# Altium footprint library 6-Connectors-4.PcbLib: 166 footprints (part 9 of 12)
Each footprint in its own frame and in the unit in brackets; x right, y up, seen from the top. Pads: shape width x height; smd on the part's side, far side on the other; paste and mask are expansions set on the pad; w line width, h text height; cw(c..) or ccw(c..) is an arc to the next point about the centre after c.
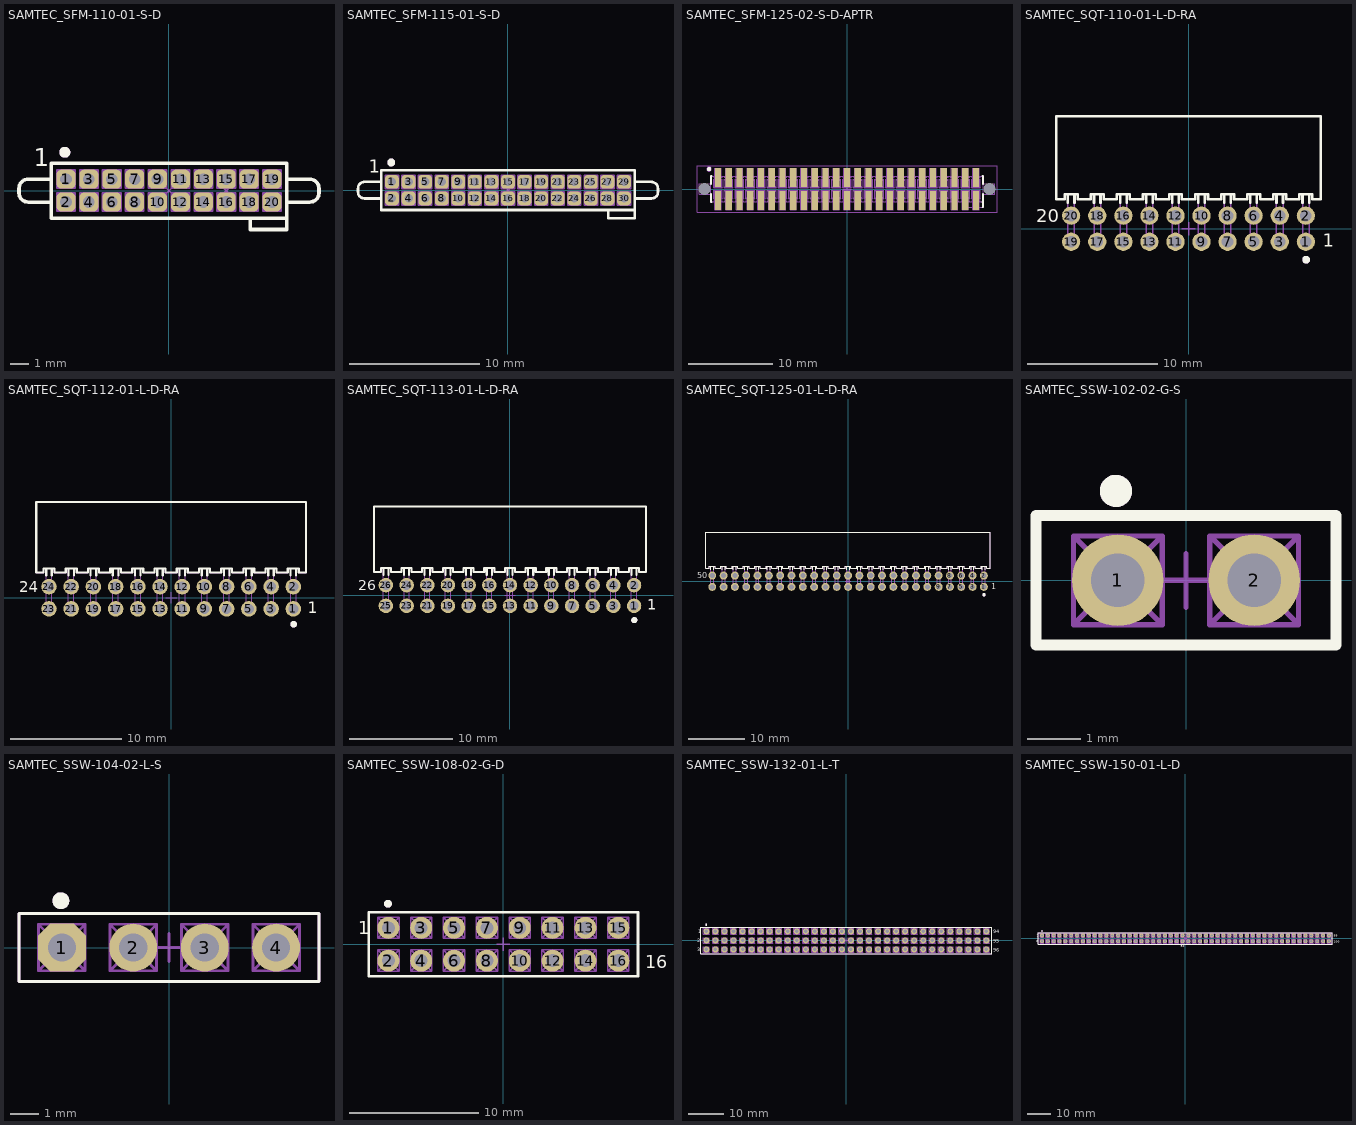
[diagram p8: the footprints below, top view; thin cyan lines are the x and y axes]

## SAMTEC_SFM-110-01-S-D [mm] "20 Contacts - Pitch 1.27mm - Dual Row Straight Through-Hole Socket"
height 4.57
pads (20):
  rrect50% 1.05x1.05 hole 0.65: 1(-5.715,0.635) 2(-5.715,-0.635) 3(-4.445,0.635) 4(-4.445,-0.635) 5(-3.175,0.635) 6(-3.175,-0.635) 7(-1.905,0.635) 8(-1.905,-0.635) 9(-0.635,0.635) 10(-0.635,-0.635) 11(0.635,0.635) 12(0.635,-0.635) 13(1.905,0.635) 14(1.905,-0.635) 15(3.175,0.635) 16(3.175,-0.635) 17(4.445,0.635) 18(4.445,-0.635) 19(5.715,0.635) 20(5.715,-0.635)
Top Overlay:
  circle w0.3: c-5.775,2.125 r0.15
  lines w0.2: -6.54,-0.635 -7.81,-0.635 cw(c-7.81,-0.127) -8.318,-0.127 -8.318,0.127 cw(c-7.81,0.127) -7.81,0.635 -6.54,0.635 ; 4.509,-1.524 4.509,-2.159 6.541,-2.159 6.541,1.524 -6.54,1.524 -6.54,-1.524 6.541,-1.524 ; 6.541,-0.635 7.811,-0.635 ccw(c7.811,-0.127) 8.319,-0.127 8.319,0.127 ccw(c7.811,0.127) 7.811,0.635 6.541,0.635
  text "1" at -7.487,1.337 h1
Mechanical 8:
  lines w0.1: -6.215,-0.635 -5.715,-0.635 ; -6.215,0.635 -5.715,0.635 ; -5.715,-1.135 -5.715,-0.635 ; -5.715,-0.135 -5.715,-0.635 ; -5.715,0.135 -5.715,0.635 ; -5.715,1.135 -5.715,0.635 ; -5.215,-0.635 -5.715,-0.635 ; -5.215,0.635 -5.715,0.635 ; -4.945,-0.635 -4.445,-0.635 ; -4.945,0.635 -4.445,0.635 ; -4.445,-1.135 -4.445,-0.635 ; -4.445,-0.135 -4.445,-0.635 ; -4.445,0.135 -4.445,0.635 ; -4.445,1.135 -4.445,0.635 ; -3.945,-0.635 -4.445,-0.635 ; -3.945,0.635 -4.445,0.635 ; -3.675,-0.635 -3.175,-0.635 ; -3.675,0.635 -3.175,0.635 ; -3.175,-1.135 -3.175,-0.635 ; -3.175,-0.135 -3.175,-0.635 ; -3.175,0.135 -3.175,0.635 ; -3.175,1.135 -3.175,0.635 ; -2.675,-0.635 -3.175,-0.635 ; -2.675,0.635 -3.175,0.635 ; -2.405,-0.635 -1.905,-0.635 ; -2.405,0.635 -1.905,0.635 ; -1.905,-1.135 -1.905,-0.635 ; -1.905,-0.135 -1.905,-0.635 ; -1.905,0.135 -1.905,0.635 ; -1.905,1.135 -1.905,0.635 ; -1.405,-0.635 -1.905,-0.635 ; -1.405,0.635 -1.905,0.635 ; -1.135,-0.635 -0.635,-0.635 ; -1.135,0.635 -0.635,0.635 ; -0.635,-1.135 -0.635,-0.635 ; -0.635,-0.135 -0.635,-0.635 ; -0.635,0.135 -0.635,0.635 ; -0.635,1.135 -0.635,0.635 ; -0.354,-0.354 0,0 ; -0.354,0.354 0,0 ; -0.135,-0.635 -0.635,-0.635 ; -0.135,0.635 -0.635,0.635 ; 0.135,-0.635 0.635,-0.635 ; 0.135,0.635 0.635,0.635 ; 0.354,-0.354 0,0 ; 0.354,0.354 0,0 ; 0.635,-1.135 0.635,-0.635 ; 0.635,-0.135 0.635,-0.635 ; 0.635,0.135 0.635,0.635 ; 0.635,1.135 0.635,0.635 ; 1.135,-0.635 0.635,-0.635 ; 1.135,0.635 0.635,0.635 ; 1.405,-0.635 1.905,-0.635 ; 1.405,0.635 1.905,0.635 ; 1.905,-1.135 1.905,-0.635 ; 1.905,-0.135 1.905,-0.635 ; 1.905,0.135 1.905,0.635 ; 1.905,1.135 1.905,0.635 ; 2.405,-0.635 1.905,-0.635 ; 2.405,0.635 1.905,0.635 ; 2.675,-0.635 3.175,-0.635 ; 2.675,0.635 3.175,0.635 ; 2.821,-0.354 3.175,0 ; 2.821,0.354 3.175,0 ; 3.175,-1.135 3.175,-0.635 ; 3.175,-0.135 3.175,-0.635 ; 3.175,0.135 3.175,0.635 ; 3.175,1.135 3.175,0.635 ; 3.529,-0.354 3.175,0 ; 3.529,0.354 3.175,0 ; 3.675,-0.635 3.175,-0.635 ; 3.675,0.635 3.175,0.635 ; 3.945,-0.635 4.445,-0.635 ; 3.945,0.635 4.445,0.635 ; 4.445,-1.135 4.445,-0.635 ; 4.445,-0.135 4.445,-0.635 ; 4.445,0.135 4.445,0.635 ; 4.445,1.135 4.445,0.635 ; 4.945,-0.635 4.445,-0.635 ; 4.945,0.635 4.445,0.635 ; 5.215,-0.635 5.715,-0.635 ; 5.215,0.635 5.715,0.635 ; 5.715,-1.135 5.715,-0.635 ; 5.715,-0.135 5.715,-0.635 ; 5.715,0.135 5.715,0.635 ; 5.715,1.135 5.715,0.635 ; 6.215,-0.635 5.715,-0.635 ; 6.215,0.635 5.715,0.635
Mechanical 14:
  drawing of 385 lines, arcs and shapes, not listed
  text "1" at -7.487,1.337 h1
3D body "SAMTEC_SFM-110-01-S-D.stp": height 4.57, standoff -2.74, extent -8.318,-2.159 8.319,1.524

## SAMTEC_SFM-115-01-S-D [mm] "30 Contacts - Pitch 1.27mm - Dual Row Straight Through-Hole Socket"
height 4.57
pads (30):
  rrect50% 1.05x1.05 hole 0.65: 1(-8.89,0.635) 2(-8.89,-0.635) 3(-7.62,0.635) 4(-7.62,-0.635) 5(-6.35,0.635) 6(-6.35,-0.635) 7(-5.08,0.635) 8(-5.08,-0.635) 9(-3.81,0.635) 10(-3.81,-0.635) 11(-2.54,0.635) 12(-2.54,-0.635) 13(-1.27,0.635) 14(-1.27,-0.635) 15(0,0.635) 16(0,-0.635) 17(1.27,0.635) 18(1.27,-0.635) 19(2.54,0.635) 20(2.54,-0.635) 21(3.81,0.635) 22(3.81,-0.635) 23(5.08,0.635) 24(5.08,-0.635) 25(6.35,0.635) 26(6.35,-0.635) 27(7.62,0.635) 28(7.62,-0.635) 29(8.89,0.635) 30(8.89,-0.635)
Top Overlay:
  circle w0.3: c-8.95,2.125 r0.15
  lines w0.2: -9.715,-0.635 -10.985,-0.635 cw(c-10.985,-0.127) -11.493,-0.127 -11.493,0.127 cw(c-10.985,0.127) -10.985,0.635 -9.715,0.635 ; 7.684,-1.524 7.684,-2.159 9.716,-2.159 9.716,1.524 -9.715,1.524 -9.715,-1.524 9.716,-1.524 ; 9.716,-0.635 10.986,-0.635 ccw(c10.986,-0.127) 11.494,-0.127 11.494,0.127 ccw(c10.986,0.127) 10.986,0.635 9.716,0.635
  text "1" at -10.662,1.337 h1
Mechanical 8:
  lines w0.1: -9.39,-0.635 -8.89,-0.635 ; -9.39,0.635 -8.89,0.635 ; -8.89,-1.135 -8.89,-0.635 ; -8.89,-0.135 -8.89,-0.635 ; -8.89,0.135 -8.89,0.635 ; -8.89,1.135 -8.89,0.635 ; -8.39,-0.635 -8.89,-0.635 ; -8.39,0.635 -8.89,0.635 ; -8.12,-0.635 -7.62,-0.635 ; -8.12,0.635 -7.62,0.635 ; -7.62,-1.135 -7.62,-0.635 ; -7.62,-0.135 -7.62,-0.635 ; -7.62,0.135 -7.62,0.635 ; -7.62,1.135 -7.62,0.635 ; -7.12,-0.635 -7.62,-0.635 ; -7.12,0.635 -7.62,0.635 ; -6.85,-0.635 -6.35,-0.635 ; -6.85,0.635 -6.35,0.635 ; -6.35,-1.135 -6.35,-0.635 ; -6.35,-0.135 -6.35,-0.635 ; -6.35,0.135 -6.35,0.635 ; -6.35,1.135 -6.35,0.635 ; -5.85,-0.635 -6.35,-0.635 ; -5.85,0.635 -6.35,0.635 ; -5.58,-0.635 -5.08,-0.635 ; -5.58,0.635 -5.08,0.635 ; -5.08,-1.135 -5.08,-0.635 ; -5.08,-0.135 -5.08,-0.635 ; -5.08,0.135 -5.08,0.635 ; -5.08,1.135 -5.08,0.635 ; -4.58,-0.635 -5.08,-0.635 ; -4.58,0.635 -5.08,0.635 ; -4.31,-0.635 -3.81,-0.635 ; -4.31,0.635 -3.81,0.635 ; -3.81,-1.135 -3.81,-0.635 ; -3.81,-0.135 -3.81,-0.635 ; -3.81,0.135 -3.81,0.635 ; -3.81,1.135 -3.81,0.635 ; -3.31,-0.635 -3.81,-0.635 ; -3.31,0.635 -3.81,0.635 ; -3.04,-0.635 -2.54,-0.635 ; -3.04,0.635 -2.54,0.635 ; -2.54,-1.135 -2.54,-0.635 ; -2.54,-0.135 -2.54,-0.635 ; -2.54,0.135 -2.54,0.635 ; -2.54,1.135 -2.54,0.635 ; -2.04,-0.635 -2.54,-0.635 ; -2.04,0.635 -2.54,0.635 ; -1.77,-0.635 -1.27,-0.635 ; -1.77,0.635 -1.27,0.635 ; -1.27,-1.135 -1.27,-0.635 ; -1.27,-0.135 -1.27,-0.635 ; -1.27,0.135 -1.27,0.635 ; -1.27,1.135 -1.27,0.635 ; -0.77,-0.635 -1.27,-0.635 ; -0.77,0.635 -1.27,0.635 ; -0.5,-0.635 0,-0.635 ; -0.5,0.635 0,0.635 ; -0.354,-0.354 0,0 ; -0.354,0.354 0,0 ; 0,-1.135 0,-0.635 ; 0,-0.135 0,-0.635 ; 0,0.135 0,0.635 ; 0,1.135 0,0.635 ; 0.354,-0.354 0,0 ; 0.354,0.354 0,0 ; 0.5,-0.635 0,-0.635 ; 0.5,0.635 0,0.635 ; 0.77,-0.635 1.27,-0.635 ; 0.77,0.635 1.27,0.635 ; 1.27,-1.135 1.27,-0.635 ; 1.27,-0.135 1.27,-0.635 ; 1.27,0.135 1.27,0.635 ; 1.27,1.135 1.27,0.635 ; 1.77,-0.635 1.27,-0.635 ; 1.77,0.635 1.27,0.635 ; 2.04,-0.635 2.54,-0.635 ; 2.04,0.635 2.54,0.635 ; 2.54,-1.135 2.54,-0.635 ; 2.54,-0.135 2.54,-0.635 ; 2.54,0.135 2.54,0.635 ; 2.54,1.135 2.54,0.635 ; 3.04,-0.635 2.54,-0.635 ; 3.04,0.635 2.54,0.635 ; 3.31,-0.635 3.81,-0.635 ; 3.31,0.635 3.81,0.635 ; 3.81,-1.135 3.81,-0.635 ; 3.81,-0.135 3.81,-0.635 ; 3.81,0.135 3.81,0.635 ; 3.81,1.135 3.81,0.635 ; 4.31,-0.635 3.81,-0.635 ; 4.31,0.635 3.81,0.635 ; 4.58,-0.635 5.08,-0.635 ; 4.58,0.635 5.08,0.635 ; 5.08,-1.135 5.08,-0.635 ; 5.08,-0.135 5.08,-0.635 ; 5.08,0.135 5.08,0.635 ; 5.08,1.135 5.08,0.635 ; 5.58,-0.635 5.08,-0.635 ; 5.58,0.635 5.08,0.635 ; 5.85,-0.635 6.35,-0.635 ; 5.85,0.635 6.35,0.635 ; 6.35,-1.135 6.35,-0.635 ; 6.35,-0.135 6.35,-0.635 ; 6.35,0.135 6.35,0.635 ; 6.35,1.135 6.35,0.635 ; 6.85,-0.635 6.35,-0.635 ; 6.85,0.635 6.35,0.635 ; 7.12,-0.635 7.62,-0.635 ; 7.12,0.635 7.62,0.635 ; 7.62,-1.135 7.62,-0.635 ; 7.62,-0.135 7.62,-0.635 ; 7.62,0.135 7.62,0.635 ; 7.62,1.135 7.62,0.635 ; 8.12,-0.635 7.62,-0.635 ; 8.12,0.635 7.62,0.635 ; 8.39,-0.635 8.89,-0.635 ; 8.39,0.635 8.89,0.635 ; 8.89,-1.135 8.89,-0.635 ; 8.89,-0.135 8.89,-0.635 ; 8.89,0.135 8.89,0.635 ; 8.89,1.135 8.89,0.635 ; 9.39,-0.635 8.89,-0.635 ; 9.39,0.635 8.89,0.635
Mechanical 14:
  drawing of 377 lines, arcs and shapes, not listed
  text "1" at -10.662,1.337 h1
3D body "SAMTEC_SFM-115-01-S-D.stp": height 4.57, standoff -2.74, extent -11.493,-2.159 11.494,1.524

## SAMTEC_SFM-125-02-S-D-APTR [mm] "50 Contacts - Pitch 1.27mm - Top Entry, Dual Row Surface Mount Receptacle With Alignment Pin"
height 4.75
pads (52):
  rect 0.73x2.2 smd: 1(-15.24,1.365) 2(-15.24,-1.365) 3(-13.97,1.365) 4(-13.97,-1.365) 5(-12.7,1.365) 6(-12.7,-1.365) 7(-11.43,1.365) 8(-11.43,-1.365) 9(-10.16,1.365) 10(-10.16,-1.365) 11(-8.89,1.365) 12(-8.89,-1.365) 13(-7.62,1.365) 14(-7.62,-1.365) 15(-6.35,1.365) 16(-6.35,-1.365) 17(-5.08,1.365) 18(-5.08,-1.365) 19(-3.81,1.365) 20(-3.81,-1.365) 21(-2.54,1.365) 22(-2.54,-1.365) 23(-1.27,1.365) 24(-1.27,-1.365) 25(0,1.365) 26(0,-1.365) 27(1.27,1.365) 28(1.27,-1.365) 29(2.54,1.365) 30(2.54,-1.365) 31(3.81,1.365) 32(3.81,-1.365) 33(5.08,1.365) 34(5.08,-1.365) 35(6.35,1.365) 36(6.35,-1.365) 37(7.62,1.365) 38(7.62,-1.365) 39(8.89,1.365) 40(8.89,-1.365) 41(10.16,1.365) 42(10.16,-1.365) 43(11.43,1.365) 44(11.43,-1.365) 45(12.7,1.365) 46(12.7,-1.365) 47(13.97,1.365) 48(13.97,-1.365) 49(15.24,1.365) 50(15.24,-1.365)
  round 1 hole 1.4 unplated mask+0.2: MEC1(-16.83,0) MEC2(16.83,0)
Top Overlay:
  circle w0.25: c-16.292,2.35 r0.125
  circle w0.25: c-16.292,2.35 r0.125
  lines w0.2: -16.066,-0.564 -16.066,-1.524 -16.01,-1.524 ; -16.066,0.564 -16.066,1.524 -16.01,1.524 ; 16.01,-2.159 16.066,-2.159 16.066,-1.524 ; 16.01,-1.524 16.066,-1.524 ; 16.01,1.524 16.066,1.524 16.066,0.564 ; 16.066,-0.564 16.066,-1.524
Mechanical 8:
  drawing of 412 lines, arcs and shapes, not listed
Mechanical 14:
  drawing of 614 lines, arcs and shapes, not listed
Mechanical 15:
  lines w0.05: -17.713,-2.725 -17.713,2.725 17.713,2.725 17.713,-2.725 -17.713,-2.725
3D body "p220-073.stp": height 0.02, standoff 0, extent 14.875,0.265 15.605,2.465
3D body "p220-073.stp": height 0.02, standoff 0, extent 14.875,-2.464 15.605,-0.264
3D body "p220-073.stp": height 0.02, standoff 0, extent 13.605,-2.464 14.335,-0.264
3D body "p220-073.stp": height 0.02, standoff 0, extent 13.605,0.265 14.335,2.465
3D body "p220-073.stp": height 0.02, standoff 0, extent 12.335,0.265 13.065,2.465
3D body "p220-073.stp": height 0.02, standoff 0, extent 12.335,-2.464 13.065,-0.264
3D body "p220-073.stp": height 0.02, standoff 0, extent 11.065,-2.464 11.795,-0.264
3D body "p220-073.stp": height 0.02, standoff 0, extent 11.065,0.265 11.795,2.465
3D body "p220-073.stp": height 0.02, standoff 0, extent 9.795,0.265 10.525,2.465
3D body "p220-073.stp": height 0.02, standoff 0, extent 9.795,-2.464 10.525,-0.264
3D body "p220-073.stp": height 0.02, standoff 0, extent 8.525,-2.464 9.255,-0.264
3D body "p220-073.stp": height 0.02, standoff 0, extent 8.525,0.265 9.255,2.465
3D body "p220-073.stp": height 0.02, standoff 0, extent 7.255,0.265 7.985,2.465
3D body "p220-073.stp": height 0.02, standoff 0, extent 7.255,-2.464 7.985,-0.264
3D body "p220-073.stp": height 0.02, standoff 0, extent 5.985,-2.464 6.715,-0.264
3D body "p220-073.stp": height 0.02, standoff 0, extent 5.985,0.265 6.715,2.465
3D body "p220-073.stp": height 0.02, standoff 0, extent 4.715,-2.464 5.445,-0.264
3D body "p220-073.stp": height 0.02, standoff 0, extent 4.715,0.265 5.445,2.465
3D body "p220-073.stp": height 0.02, standoff 0, extent 3.445,0.265 4.175,2.465
3D body "p220-073.stp": height 0.02, standoff 0, extent 3.445,-2.464 4.175,-0.264
3D body "p220-073.stp": height 0.02, standoff 0, extent 2.175,-2.464 2.905,-0.264
3D body "p220-073.stp": height 0.02, standoff 0, extent 2.175,0.265 2.905,2.465
3D body "p220-073.stp": height 0.02, standoff 0, extent 0.905,0.265 1.635,2.465
3D body "p220-073.stp": height 0.02, standoff 0, extent 0.905,-2.464 1.635,-0.264
3D body "p220-073.stp": height 0.02, standoff 0, extent -0.365,-2.464 0.365,-0.264
3D body "p220-073.stp": height 0.02, standoff 0, extent -0.365,0.265 0.365,2.465
3D body "p220-073.stp": height 0.02, standoff 0, extent -1.635,0.265 -0.905,2.465
3D body "p220-073.stp": height 0.02, standoff 0, extent -1.635,-2.464 -0.905,-0.264
3D body "p220-073.stp": height 0.02, standoff 0, extent -2.905,-2.464 -2.175,-0.264
3D body "p220-073.stp": height 0.02, standoff 0, extent -2.905,0.265 -2.175,2.465
3D body "p220-073.stp": height 0.02, standoff 0, extent -4.175,0.265 -3.445,2.465
3D body "p220-073.stp": height 0.02, standoff 0, extent -4.175,-2.464 -3.445,-0.264
3D body "p220-073.stp": height 0.02, standoff 0, extent -5.445,-2.464 -4.715,-0.264
3D body "p220-073.stp": height 0.02, standoff 0, extent -5.445,0.265 -4.715,2.465
3D body "p220-073.stp": height 0.02, standoff 0, extent -6.715,-2.464 -5.985,-0.264
3D body "p220-073.stp": height 0.02, standoff 0, extent -6.715,0.265 -5.985,2.465
3D body "p220-073.stp": height 0.02, standoff 0, extent -7.985,0.265 -7.255,2.465
3D body "p220-073.stp": height 0.02, standoff 0, extent -7.985,-2.464 -7.255,-0.264
3D body "p220-073.stp": height 0.02, standoff 0, extent -9.255,-2.464 -8.525,-0.264
3D body "p220-073.stp": height 0.02, standoff 0, extent -9.255,0.265 -8.525,2.465
3D body "p220-073.stp": height 0.02, standoff 0, extent -10.525,0.265 -9.795,2.465
3D body "p220-073.stp": height 0.02, standoff 0, extent -10.525,-2.464 -9.795,-0.264
3D body "p220-073.stp": height 0.02, standoff 0, extent -11.795,-2.464 -11.065,-0.264
3D body "p220-073.stp": height 0.02, standoff 0, extent -11.795,0.265 -11.065,2.465
3D body "p220-073.stp": height 0.02, standoff 0, extent -13.065,-2.464 -12.335,-0.264
3D body "p220-073.stp": height 0.02, standoff 0, extent -13.065,0.265 -12.335,2.465
3D body "p220-073.stp": height 0.02, standoff 0, extent -14.335,-2.464 -13.605,-0.264
3D body "p220-073.stp": height 0.02, standoff 0, extent -14.335,0.265 -13.605,2.465
3D body "p220-073.stp": height 0.02, standoff 0, extent -15.605,-2.464 -14.875,-0.264
3D body "p220-073.stp": height 0.02, standoff 0, extent -15.605,0.265 -14.875,2.465
3D body "SAMTEC_SFM-125-02-S-D-APTR.stp": height 4.7, standoff -1.14, extent -17.465,-2.159 17.465,2.096

## SAMTEC_SQT-110-01-L-D-RA [mm] "20 Contacts - Pitch 2mm - Dual Row Right Angle Socket"
height 4
pads (20):
  round 1.4 hole 0.9: 1(9,-1) 2(9,1) 3(7,-1) 4(7,1) 5(5,-1) 6(5,1) 7(3,-1) 8(3,1) 9(1,-1) 10(1,1) 11(-1,-1) 12(-1,1) 13(-3,-1) 14(-3,1) 15(-5,-1) 16(-5,1) 17(-7,-1) 18(-7,1) 19(-9,-1) 20(-9,1)
Top Overlay:
  circle w0.3: c9.027,-2.378 r0.15
  lines w0.2: -9.25,2 -9.25,2.651 ; -8.75,2 -8.75,2.651 ; -7.25,2 -7.25,2.651 ; -6.75,2 -6.75,2.651 ; -5.25,2 -5.25,2.651 ; -4.75,2 -4.75,2.651 ; -3.25,2 -3.25,2.651 ; -2.75,2 -2.75,2.651 ; -1.25,2 -1.25,2.651 ; -0.75,2 -0.75,2.651 ; 0.75,2 0.75,2.651 ; 1.25,2 1.25,2.651 ; 2.75,2 2.75,2.651 ; 3.25,2 3.25,2.651 ; 4.75,2 4.75,2.651 ; 5.25,2 5.25,2.651 ; 6.75,2 6.75,2.651 ; 7.25,2 7.25,2.651 ; 8.75,2 8.75,2.651 ; 9.25,2 9.25,2.651 ; -10.15,2.27 -9.492,2.27 -9.492,2.651 -8.508,2.651 -8.508,2.27 -7.492,2.27 -7.492,2.651 -6.508,2.651 -6.508,2.27 -5.492,2.27 -5.492,2.651 -4.508,2.651 -4.508,2.27 -3.492,2.27 -3.492,2.651 -2.508,2.651 -2.508,2.27 -1.492,2.27 -1.492,2.651 -0.508,2.651 -0.508,2.27 0.508,2.27 0.508,2.651 1.492,2.651 1.492,2.27 2.508,2.27 2.508,2.651 3.492,2.651 3.492,2.27 4.508,2.27 4.508,2.651 5.492,2.651 5.492,2.27 6.508,2.27 6.508,2.651 7.492,2.651 7.492,2.27 8.508,2.27 8.508,2.651 9.492,2.651 9.492,2.27 10.15,2.27 10.15,8.62 -10.15,8.62 -10.15,2.27
  text "1" at 10.3,-1.4 h1.02
  text "20" at -11.7,0.5 h1
Mechanical 8:
  lines w0.1: -9.5,-1 -9,-1 ; -9.5,1 -9,1 ; -9,-1.5 -9,-1 ; -9,-0.5 -9,-1 ; -9,0.5 -9,1 ; -9,1.5 -9,1 ; -8.5,-1 -9,-1 ; -8.5,1 -9,1 ; -7.5,-1 -7,-1 ; -7.5,1 -7,1 ; -7,-1.5 -7,-1 ; -7,-0.5 -7,-1 ; -7,0.5 -7,1 ; -7,1.5 -7,1 ; -6.5,-1 -7,-1 ; -6.5,1 -7,1 ; -5.5,-1 -5,-1 ; -5.5,1 -5,1 ; -5,-1.5 -5,-1 ; -5,-0.5 -5,-1 ; -5,0.5 -5,1 ; -5,1.5 -5,1 ; -4.5,-1 -5,-1 ; -4.5,1 -5,1 ; -3.5,-1 -3,-1 ; -3.5,1 -3,1 ; -3,-1.5 -3,-1 ; -3,-0.5 -3,-1 ; -3,0.5 -3,1 ; -3,1.5 -3,1 ; -2.5,-1 -3,-1 ; -2.5,1 -3,1 ; -1.5,-1 -1,-1 ; -1.5,1 -1,1 ; -1,-1.5 -1,-1 ; -1,-0.5 -1,-1 ; -1,0.5 -1,1 ; -1,1.5 -1,1 ; -0.5,-1 -1,-1 ; -0.5,0 0,0 ; -0.5,1 -1,1 ; 0,-0.5 0,0 ; 0,0.5 0,0 ; 0.5,-1 1,-1 ; 0.5,0 0,0 ; 0.5,1 1,1 ; 1,-1.5 1,-1 ; 1,-0.5 1,-1 ; 1,0.5 1,1 ; 1,1.5 1,1 ; 1.5,-1 1,-1 ; 1.5,1 1,1 ; 2.5,-1 3,-1 ; 2.5,1 3,1 ; 3,-1.5 3,-1 ; 3,-0.5 3,-1 ; 3,0.5 3,1 ; 3,1.5 3,1 ; 3.5,-1 3,-1 ; 3.5,1 3,1 ; 4.5,-1 5,-1 ; 4.5,1 5,1 ; 5,-1.5 5,-1 ; 5,-0.5 5,-1 ; 5,0.5 5,1 ; 5,1.5 5,1 ; 5.5,-1 5,-1 ; 5.5,1 5,1 ; 6.5,-1 7,-1 ; 6.5,1 7,1 ; 7,-1.5 7,-1 ; 7,-0.5 7,-1 ; 7,0.5 7,1 ; 7,1.5 7,1 ; 7.5,-1 7,-1 ; 7.5,1 7,1 ; 8.5,-1 9,-1 ; 8.5,1 9,1 ; 9,-1.5 9,-1 ; 9,-0.5 9,-1 ; 9,0.5 9,1 ; 9,1.5 9,1 ; 9.5,-1 9,-1 ; 9.5,1 9,1
Mechanical 14:
  circle w0.3: c9.027,-2.378 r0.15
  lines w0.1: -9.25,2.651 -9.25,-1.218 -8.75,-1.219 -8.75,2.651 ; -7.25,2.651 -7.25,-1.22 -6.75,-1.22 -6.75,2.651 ; -5.25,2.651 -5.25,-1.221 -4.75,-1.221 -4.75,2.651 ; -3.25,2.651 -3.25,-1.222 -2.75,-1.223 -2.75,2.651 ; -1.25,2.651 -1.25,-1.224 -0.75,-1.224 -0.75,2.651 ; 0.75,2.651 0.75,-1.225 1.25,-1.225 1.25,2.651 ; 2.75,2.651 2.75,-1.226 3.25,-1.227 3.25,2.651 ; 4.75,2.651 4.75,-1.228 5.25,-1.228 5.25,2.651 ; 6.75,2.651 6.75,-1.229 7.25,-1.229 7.25,2.651 ; 8.75,2.651 8.75,-1.23 9.25,-1.23 9.25,2.651 ; -10.15,2.27 -9.492,2.27 -9.492,2.651 -8.508,2.651 -8.508,2.27 -7.492,2.27 -7.492,2.651 -6.508,2.651 -6.508,2.27 -5.492,2.27 -5.492,2.651 -4.508,2.651 -4.508,2.27 -3.492,2.27 -3.492,2.651 -2.508,2.651 -2.508,2.27 -1.492,2.27 -1.492,2.651 -0.508,2.651 -0.508,2.27 0.508,2.27 0.508,2.651 1.492,2.651 1.492,2.27 2.508,2.27 2.508,2.651 3.492,2.651 3.492,2.27 4.508,2.27 4.508,2.651 5.492,2.651 5.492,2.27 6.508,2.27 6.508,2.651 7.492,2.651 7.492,2.27 8.508,2.27 8.508,2.651 9.492,2.651 9.492,2.27 10.15,2.27 10.15,8.62 -10.15,8.62 -10.15,2.27
  text "1" at 10.3,-1.4 h1.02
  text "20" at -11.7,0.5 h1
3D body "v160-080.stp": height 0.02, standoff -1.65, extent 8.2,-1.8 9.8,-0.2
3D body "v160-080.stp": height 0.02, standoff -1.65, extent 8.2,0.2 9.8,1.8
3D body "v160-080.stp": height 0.02, standoff -1.65, extent 6.2,0.2 7.8,1.8
3D body "v160-080.stp": height 0.02, standoff -1.65, extent 6.2,-1.8 7.8,-0.2
3D body "v160-080.stp": height 0.02, standoff -1.65, extent 4.2,-1.8 5.8,-0.2
3D body "v160-080.stp": height 0.02, standoff -1.65, extent 4.2,0.2 5.8,1.8
3D body "v160-080.stp": height 0.02, standoff -1.65, extent 2.2,-1.8 3.8,-0.2
3D body "v160-080.stp": height 0.02, standoff -1.65, extent 2.2,0.2 3.8,1.8
3D body "v160-080.stp": height 0.02, standoff -1.65, extent 0.2,-1.8 1.8,-0.2
3D body "v160-080.stp": height 0.02, standoff -1.65, extent 0.2,0.2 1.8,1.8
3D body "v160-080.stp": height 0.02, standoff -1.65, extent -1.8,-1.8 -0.2,-0.2
3D body "v160-080.stp": height 0.02, standoff -1.65, extent -1.8,0.2 -0.2,1.8
3D body "v160-080.stp": height 0.02, standoff -1.65, extent -3.8,-1.8 -2.2,-0.2
3D body "v160-080.stp": height 0.02, standoff -1.65, extent -3.8,0.2 -2.2,1.8
3D body "v160-080.stp": height 0.02, standoff -1.65, extent -5.8,0.2 -4.2,1.8
3D body "v160-080.stp": height 0.02, standoff -1.65, extent -5.8,-1.8 -4.2,-0.2
3D body "v160-080.stp": height 0.02, standoff -1.65, extent -7.8,-1.8 -6.2,-0.2
3D body "v160-080.stp": height 0.02, standoff -1.65, extent -7.8,0.2 -6.2,1.8
3D body "v160-080.stp": height 0.02, standoff -1.65, extent -9.8,-1.8 -8.2,-0.2
3D body "v160-080.stp": height 0.02, standoff -1.65, extent -9.8,0.2 -8.2,1.8
3D body "SAMTEC_SQT-110-01-L-D-RA.stp": height 4, standoff -2.29, extent -10.149,-1.25 10.151,8.62

## SAMTEC_SQT-112-01-L-D-RA [mm] "24 Contacts - Pitch 2mm - Dual Row Right Angle Socket"
height 4
pads (24):
  round 1.4 hole 0.9: 1(11,-1) 2(11,1) 3(9,-1) 4(9,1) 5(7,-1) 6(7,1) 7(5,-1) 8(5,1) 9(3,-1) 10(3,1) 11(1,-1) 12(1,1) 13(-1,-1) 14(-1,1) 15(-3,-1) 16(-3,1) 17(-5,-1) 18(-5,1) 19(-7,-1) 20(-7,1) 21(-9,-1) 22(-9,1) 23(-11,-1) 24(-11,1)
Top Overlay:
  circle w0.3: c11.027,-2.378 r0.15
  lines w0.2: -11.25,2 -11.25,2.651 ; -10.75,2 -10.75,2.651 ; -9.25,2 -9.25,2.651 ; -8.75,2 -8.75,2.651 ; -7.25,2 -7.25,2.651 ; -6.75,2 -6.75,2.651 ; -5.25,2 -5.25,2.651 ; -4.75,2 -4.75,2.651 ; -3.25,2 -3.25,2.651 ; -2.75,2 -2.75,2.651 ; -1.25,2 -1.25,2.651 ; -0.75,2 -0.75,2.651 ; 0.75,2 0.75,2.651 ; 1.25,2 1.25,2.651 ; 2.75,2 2.75,2.651 ; 3.25,2 3.25,2.651 ; 4.75,2 4.75,2.651 ; 5.25,2 5.25,2.651 ; 6.75,2 6.75,2.651 ; 7.25,2 7.25,2.651 ; 8.75,2 8.75,2.651 ; 9.25,2 9.25,2.651 ; 10.75,2 10.75,2.651 ; 11.25,2 11.25,2.651 ; -12.15,2.27 -12.15,8.62 12.15,8.62 12.15,2.27 11.492,2.27 11.492,2.651 10.508,2.651 10.508,2.27 9.492,2.27 9.492,2.651 8.508,2.651 8.508,2.27 7.492,2.27 7.492,2.651 6.508,2.651 6.508,2.27 5.492,2.27 5.492,2.651 4.508,2.651 4.508,2.27 3.492,2.27 3.492,2.651 2.508,2.651 2.508,2.27 1.492,2.27 1.492,2.651 0.508,2.651 0.508,2.27 -0.508,2.27 -0.508,2.651 -1.492,2.651 -1.492,2.27 -2.508,2.27 -2.508,2.651 -3.492,2.651 -3.492,2.27 -4.508,2.27 -4.508,2.651 -5.492,2.651 -5.492,2.27 -6.508,2.27 -6.508,2.651 -7.492,2.651 -7.492,2.27 -8.508,2.27 -8.508,2.651 -9.492,2.651 -9.492,2.27 -10.508,2.27 -10.508,2.651 -11.492,2.651 -11.492,2.27 -12.15,2.27
  text "1" at 12.3,-1.4 h1.02
  text "24" at -13.7,0.5 h1
Mechanical 8:
  lines w0.1: -11.5,-1 -11,-1 ; -11.5,1 -11,1 ; -11,-1.5 -11,-1 ; -11,-0.5 -11,-1 ; -11,0.5 -11,1 ; -11,1.5 -11,1 ; -10.5,-1 -11,-1 ; -10.5,1 -11,1 ; -9.5,-1 -9,-1 ; -9.5,1 -9,1 ; -9,-1.5 -9,-1 ; -9,-0.5 -9,-1 ; -9,0.5 -9,1 ; -9,1.5 -9,1 ; -8.5,-1 -9,-1 ; -8.5,1 -9,1 ; -7.5,-1 -7,-1 ; -7.5,1 -7,1 ; -7,-1.5 -7,-1 ; -7,-0.5 -7,-1 ; -7,0.5 -7,1 ; -7,1.5 -7,1 ; -6.5,-1 -7,-1 ; -6.5,1 -7,1 ; -5.5,-1 -5,-1 ; -5.5,1 -5,1 ; -5,-1.5 -5,-1 ; -5,-0.5 -5,-1 ; -5,0.5 -5,1 ; -5,1.5 -5,1 ; -4.5,-1 -5,-1 ; -4.5,1 -5,1 ; -3.5,-1 -3,-1 ; -3.5,1 -3,1 ; -3,-1.5 -3,-1 ; -3,-0.5 -3,-1 ; -3,0.5 -3,1 ; -3,1.5 -3,1 ; -2.5,-1 -3,-1 ; -2.5,1 -3,1 ; -1.5,-1 -1,-1 ; -1.5,1 -1,1 ; -1,-1.5 -1,-1 ; -1,-0.5 -1,-1 ; -1,0.5 -1,1 ; -1,1.5 -1,1 ; -0.5,-1 -1,-1 ; -0.5,0 0,0 ; -0.5,1 -1,1 ; 0,-0.5 0,0 ; 0,0.5 0,0 ; 0.5,-1 1,-1 ; 0.5,0 0,0 ; 0.5,1 1,1 ; 1,-1.5 1,-1 ; 1,-0.5 1,-1 ; 1,0.5 1,1 ; 1,1.5 1,1 ; 1.5,-1 1,-1 ; 1.5,1 1,1 ; 2.5,-1 3,-1 ; 2.5,1 3,1 ; 3,-1.5 3,-1 ; 3,-0.5 3,-1 ; 3,0.5 3,1 ; 3,1.5 3,1 ; 3.5,-1 3,-1 ; 3.5,1 3,1 ; 4.5,-1 5,-1 ; 4.5,1 5,1 ; 5,-1.5 5,-1 ; 5,-0.5 5,-1 ; 5,0.5 5,1 ; 5,1.5 5,1 ; 5.5,-1 5,-1 ; 5.5,1 5,1 ; 6.5,-1 7,-1 ; 6.5,1 7,1 ; 7,-1.5 7,-1 ; 7,-0.5 7,-1 ; 7,0.5 7,1 ; 7,1.5 7,1 ; 7.5,-1 7,-1 ; 7.5,1 7,1 ; 8.5,-1 9,-1 ; 8.5,1 9,1 ; 9,-1.5 9,-1 ; 9,-0.5 9,-1 ; 9,0.5 9,1 ; 9,1.5 9,1 ; 9.5,-1 9,-1 ; 9.5,1 9,1 ; 10.5,-1 11,-1 ; 10.5,1 11,1 ; 11,-1.5 11,-1 ; 11,-0.5 11,-1 ; 11,0.5 11,1 ; 11,1.5 11,1 ; 11.5,-1 11,-1 ; 11.5,1 11,1
Mechanical 14:
  circle w0.3: c11.027,-2.378 r0.15
  lines w0.1: -11.25,2.651 -11.25,-1.218 -10.75,-1.219 -10.75,2.651 ; -9.25,2.651 -9.25,-1.22 -8.75,-1.22 -8.75,2.651 ; -7.25,2.651 -7.25,-1.221 -6.75,-1.221 -6.75,2.651 ; -5.25,2.651 -5.25,-1.222 -4.75,-1.223 -4.75,2.651 ; -3.25,2.651 -3.25,-1.224 -2.75,-1.224 -2.75,2.651 ; -1.25,2.651 -1.25,-1.225 -0.75,-1.225 -0.75,2.651 ; 0.75,2.651 0.75,-1.226 1.25,-1.227 1.25,2.651 ; 2.75,2.651 2.75,-1.228 3.25,-1.228 3.25,2.651 ; 4.75,2.651 4.75,-1.229 5.25,-1.229 5.25,2.651 ; 6.75,2.651 6.75,-1.23 7.25,-1.23 7.25,2.651 ; 8.75,2.651 8.75,-1.23 9.25,-1.23 9.25,2.651 ; 10.75,2.651 10.75,-1.23 11.25,-1.23 11.25,2.651 ; -12.15,2.27 -12.15,8.62 12.15,8.62 12.15,2.27 11.492,2.27 11.492,2.651 10.508,2.651 10.508,2.27 9.492,2.27 9.492,2.651 8.508,2.651 8.508,2.27 7.492,2.27 7.492,2.651 6.508,2.651 6.508,2.27 5.492,2.27 5.492,2.651 4.508,2.651 4.508,2.27 3.492,2.27 3.492,2.651 2.508,2.651 2.508,2.27 1.492,2.27 1.492,2.651 0.508,2.651 0.508,2.27 -0.508,2.27 -0.508,2.651 -1.492,2.651 -1.492,2.27 -2.508,2.27 -2.508,2.651 -3.492,2.651 -3.492,2.27 -4.508,2.27 -4.508,2.651 -5.492,2.651 -5.492,2.27 -6.508,2.27 -6.508,2.651 -7.492,2.651 -7.492,2.27 -8.508,2.27 -8.508,2.651 -9.492,2.651 -9.492,2.27 -10.508,2.27 -10.508,2.651 -11.492,2.651 -11.492,2.27 -12.15,2.27